# Altium schematic symbol library Transistor.SchLib: 3457 symbols (part 11 of 27)
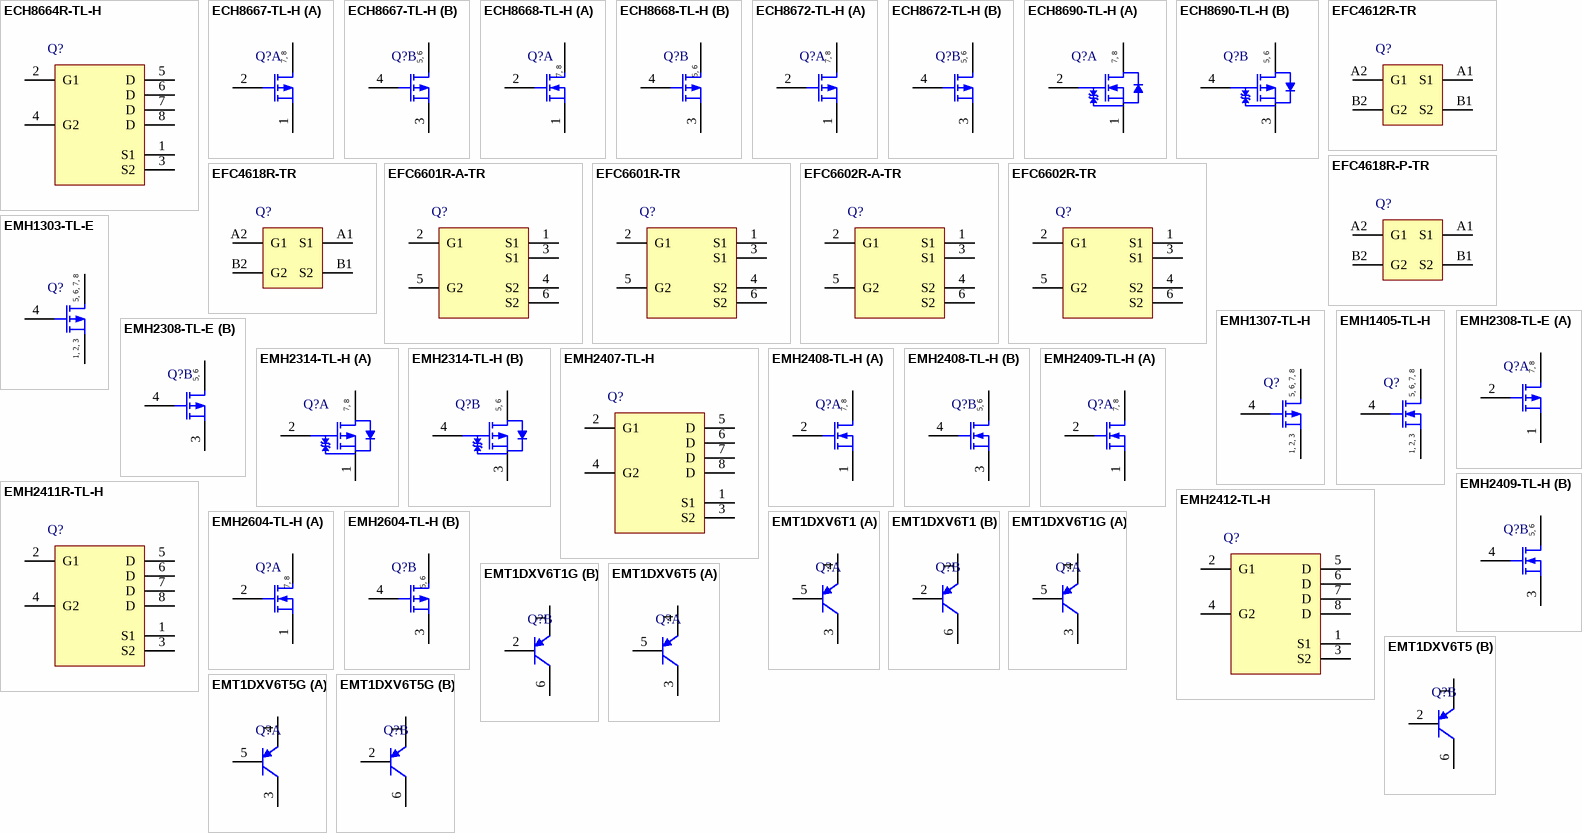
[diagram p104: symbols ECH8664R-TL-H to EMT1DXV6T5G]

## ECH8690-TL-H
designator Q?
Power MOSFET, 60 V, 4.7 A, 55 mOhm -60 V, -3.5 A, 94 mOhm Complememtary Dual, 8-Pin ECH, Pb-Free, Tape and Reel; Manufacturer: On Semiconductor; PartNumber: ECH8690-TL-H; Channel Polarity: Complementary; PD Max (W): 1.5; V(BR)DSS Min (V): 60; VGS Max (V): 20; VGS(th) Max (V): 2.6; PackageReference: ECH-8; PackageDescription: 8-Pin SOT23, Body 2.9 x 2.3 mm, Pitch 0.65 mm; Supplier 1: Newark; Supplier Part Number 1: 97W4990; Supplier 2: Mouser; Supplier Part Number 2: 863-ECH8690-TL-H; Configuration: Dual; Package Type: SOT-28 FL / ECH-8; Packing: Tape and Reel; RoHS: Pb-Free; Mounting Technology: Surface Mount; ComponentLink1Description: Manufacturer URL; ComponentLink1URL: http://www.onsemi.com/; ComponentLink2Description: Datasheet; ComponentLink2URL: http://www.onsemi.com/pub_link/Collateral/ENA2185-D.PDF; ComponentLink3Description: Package Specification; ComponentLink3URL: http://www.onsemi.com/pub_link/Collateral/ECH8308-D.PDF
footprint ONSC-ECH-8_V (SOT23, 8-Leads, Body 2.9x2.3mm, Pitch 0.65mm)
part A pins: 1 S1, 2 G1, 7 D1, 8 D1
part B pins: 3 S2, 4 G2, 5 D2, 6 D2
part A text: 7, 8
part B text: 5, 6

## EFC4612R-TR
designator Q?
N-Channel Power MOSFET, 24 V, 6 A, 45 mOhm, 4-Pin EFCP, Pb-Free, Tape and Reel; Manufacturer: On Semiconductor; PartNumber: EFC4612R-TR; Channel Polarity: N Channel; Configuration: Dual; V(BR)DSS Min (V): 24; VGS Max (V): 12; VGS(th) Max (V): 1.3; PackageVersion: Rev. O, 02/2012; PackageReference: EFCP1313-4CC-037-4-567DP; PackageDescription: 4-Ball Wafer Level Chip Scale Package, Body 1.26 x 1.26 mm, Pitch 0.65 mm; Supplier 1: Digi-Key; Supplier Part Number 1: EFC4612R-TR-ND; Supplier 2: Newark; Supplier Part Number 2: 65T1221; Supplier 3: Mouser; Supplier Part Number 3: 863-EFC4612R-TR; Package Type: WLCSP-4; Packing: Tape and Reel; RoHS: Pb-Free; Mounting Technology: Surface Mount; ComponentLink1Description: Manufacturer URL; ComponentLink1URL: http://www.onsemi.com/; ComponentLink2Description: Datasheet; ComponentLink2URL: http://www.onsemi.com/pub_link/Collateral/ENA1477-D.PDF; ComponentLink3Description: Package Specification; ComponentLink3URL: http://www.onsemi.com/pub_link/Collateral/567DP.PDF
footprint ONSC-EFCP1313-4CC-037-4-567DP (BGA, 4-Balls, Body 1.26x1.26mm, Pitch 0.65mm)
pins: A1 S1, A2 G1, B1 S2, B2 G2

## EFC4618R-P-TR
designator Q?
N-Channel Power MOSFET, 24 V, 6 A, 23 mOhm, 4-Pin EFCP, Pb-Free, Tape and Reel; Manufacturer: On Semiconductor; PartNumber: EFC4618R-P-TR; Channel Polarity: N Channel; Configuration: Dual; VGS Max (V): 12; VGS(th) Max (V): 1.3; PackageVersion: Rev. O, 02/2012; PackageReference: EFCP1818-4CC-037-4-567DK; PackageDescription: 4-Ball Wafer Level Chip Scale Package, Body 1.81 x 1.81 mm, Pitch 0.65 mm; Supplier 1: Mouser; Supplier Part Number 1: 863-EFC4618R-P-TR; Package Type: WLCSP-4; Packing: Tape and Reel; RoHS: Pb-Free; Mounting Technology: Surface Mount; ComponentLink1Description: Manufacturer URL; ComponentLink1URL: http://www.onsemi.com/; ComponentLink2Description: Datasheet; ComponentLink2URL: http://www.onsemi.com/pub_link/Collateral/ENA1123A-D.PDF; ComponentLink3Description: Package Specification; ComponentLink3URL: http://www.onsemi.com/pub_link/Collateral/567DK.PDF
footprint ONSC-EFCP1818-4CC-037-4-567DK_V (BGA, 4-Balls, Body 1.81x1.81mm, Pitch 0.65mm)
pins: A1 S1, A2 G1, B1 S2, B2 G2

## EFC4618R-TR
designator Q?
N-Channel Power MOSFET, 24 V, 6 A, 23 mOhm, 4-Pin EFCP, Pb-Free, Tape and Reel; Manufacturer: On Semiconductor; PartNumber: EFC4618R-TR; Channel Polarity: N Channel; Configuration: Dual; VGS Max (V): 12; VGS(th) Max (V): 1.3; PackageVersion: Rev. O, 02/2012; PackageReference: EFCP1818-4CC-037-4-567DK; PackageDescription: 4-Ball Wafer Level Chip Scale Package, Body 1.81 x 1.81 mm, Pitch 0.65 mm; Supplier 1: Digi-Key; Supplier Part Number 1: EFC4618R-TR-ND; Supplier 2: Mouser; Supplier Part Number 2: 863-EFC4618R-TR; Package Type: WLCSP-4; Packing: Tape and Reel; RoHS: Pb-Free; Mounting Technology: Surface Mount; ComponentLink1Description: Manufacturer URL; ComponentLink1URL: http://www.onsemi.com/; ComponentLink2Description: Datasheet; ComponentLink2URL: http://www.onsemi.com/pub_link/Collateral/ENA1123A-D.PDF; ComponentLink3Description: Package Specification; ComponentLink3URL: http://www.onsemi.com/pub_link/Collateral/567DK.PDF
footprint ONSC-EFCP1818-4CC-037-4-567DK_V (BGA, 4-Balls, Body 1.81x1.81mm, Pitch 0.65mm)
pins: A1 S1, A2 G1, B1 S2, B2 G2

## EFC6601R-A-TR
designator Q?
N-Channel Power MOSFET, 24 V, 13 A, 11.5 mOhm, 6-Pin EFCP, Pb-Free, Tape and Reel; Manufacturer: On Semiconductor; PartNumber: EFC6601R-A-TR; Channel Polarity: N Channel; Configuration: Dual; VGS Max (V): 12; VGS(th) Max (V): 1.3; PackageVersion: Rev. O, 05/2012; PackageReference: EFCP2718-6CE-020-6-567FK; PackageDescription: 6-Ball Wafer Level Chip Scale Package, Body 2.7 x 1.81 mm, Pitch 0.65 mm; Supplier 1: Newark; Supplier Part Number 1: 56W5203; Supplier 2: Mouser; Supplier Part Number 2: 863-EFC6601R-A-TR; Package Type: WLCSP-6; Packing: Tape and Reel; RoHS: Pb-Free; Mounting Technology: Surface Mount; ComponentLink1Description: Manufacturer URL; ComponentLink1URL: http://www.onsemi.com/; ComponentLink2Description: Datasheet; ComponentLink2URL: http://www.onsemi.com/pub_link/Collateral/ENA2151-D.PDF; ComponentLink3Description: Package Specification; ComponentLink3URL: http://www.onsemi.com/pub_link/Collateral/ENA2152-D.PDF
footprint ONSC-EFCP2718-6CE-020-6-567FK (BGA, 6-Balls, Body 2.7x1.81mm, Pitch 0.65mm)
pins: 1 S1, 2 G1, 3 S1, 4 S2, 5 G2, 6 S2

## EFC6601R-TR
designator Q?
N-Channel Power MOSFET, 24 V, 13 A, 11.5 mOhm, 6-Pin EFCP, Pb-Free, Tape and Reel; Manufacturer: On Semiconductor; PartNumber: EFC6601R-TR; Channel Polarity: N Channel; Configuration: Dual; VGS Max (V): 12; VGS(th) Max (V): 1.3; PackageVersion: Rev. O, 05/2012; PackageReference: EFCP2718-6CE-020-6-567FK; PackageDescription: 6-Ball Wafer Level Chip Scale Package, Body 2.7 x 1.81 mm, Pitch 0.65 mm; Supplier 1: Newark; Supplier Part Number 1: 56W5204; Supplier 2: Mouser; Supplier Part Number 2: 863-EFC6601R-TR; Package Type: WLCSP-6; Packing: Tape and Reel; RoHS: Pb-Free; Mounting Technology: Surface Mount; ComponentLink1Description: Manufacturer URL; ComponentLink1URL: http://www.onsemi.com/; ComponentLink2Description: Datasheet; ComponentLink2URL: http://www.onsemi.com/pub_link/Collateral/ENA2151-D.PDF; ComponentLink3Description: Package Specification; ComponentLink3URL: http://www.onsemi.com/pub_link/Collateral/ENA2152-D.PDF
footprint ONSC-EFCP2718-6CE-020-6-567FK (BGA, 6-Balls, Body 2.7x1.81mm, Pitch 0.65mm)
pins: 1 S1, 2 G1, 3 S1, 4 S2, 5 G2, 6 S2

## EFC6602R-A-TR
designator Q?
N-Channel Power MOSFET, 12 V, 18 A, 5.9 mOhm, 6-Pin EFCP, Pb-Free, Tape and Reel; Manufacturer: On Semiconductor; PartNumber: EFC6602R-A-TR; Channel Polarity: N Channel; Configuration: Dual; VGS Max (V): 12; VGS(th) Max (V): 1.3; PackageVersion: Rev. O, 05/2012; PackageReference: EFCP2718-6CE-020-6-567FK; PackageDescription: 6-Ball Wafer Level Chip Scale Package, Body 2.7 x 1.81 mm, Pitch 0.65 mm; Supplier 1: Newark; Supplier Part Number 1: 56W5205; Supplier 2: Mouser; Supplier Part Number 2: 863-EFC6602R-A-TR; Package Type: WLCSP-6; Packing: Tape and Reel; RoHS: Pb-Free; Mounting Technology: Surface Mount; ComponentLink1Description: Manufacturer URL; ComponentLink1URL: http://www.onsemi.com/; ComponentLink2Description: Datasheet; ComponentLink2URL: http://www.onsemi.com/pub_link/Collateral/ENA2152-D.PDF; ComponentLink3Description: Package Specification; ComponentLink3URL: http://www.onsemi.com/pub_link/Collateral/ENA2152-D.PDF
footprint ONSC-EFCP2718-6CE-020-6-567FK (BGA, 6-Balls, Body 2.7x1.81mm, Pitch 0.65mm)
pins: 1 S1, 2 G1, 3 S1, 4 S2, 5 G2, 6 S2

## EFC6602R-TR
designator Q?
N-Channel Power MOSFET, 12 V, 18 A, 5.9 mOhm, 6-Pin EFCP, Pb-Free, Tape and Reel; Manufacturer: On Semiconductor; PartNumber: EFC6602R-TR; Channel Polarity: N Channel; Configuration: Dual; VGS Max (V): 12; VGS(th) Max (V): 1.3; PackageVersion: Rev. O, 05/2012; PackageReference: EFCP2718-6CE-020-6-567FK; PackageDescription: 6-Ball Wafer Level Chip Scale Package, Body 2.7 x 1.81 mm, Pitch 0.65 mm; Supplier 1: Newark; Supplier Part Number 1: 45W8151; Supplier 2: Mouser; Supplier Part Number 2: 863-EFC6602R-TR; Package Type: WLCSP-6; Packing: Tape and Reel; RoHS: Pb-Free; Mounting Technology: Surface Mount; ComponentLink1Description: Manufacturer URL; ComponentLink1URL: http://www.onsemi.com/; ComponentLink2Description: Datasheet; ComponentLink2URL: http://www.onsemi.com/pub_link/Collateral/ENA2152-D.PDF; ComponentLink3Description: Package Specification; ComponentLink3URL: http://www.onsemi.com/pub_link/Collateral/ENA2152-D.PDF
footprint ONSC-EFCP2718-6CE-020-6-567FK (BGA, 6-Balls, Body 2.7x1.81mm, Pitch 0.65mm)
pins: 1 S1, 2 G1, 3 S1, 4 S2, 5 G2, 6 S2

## EMH1303-TL-E
designator Q?
P-Channel Power MOSFET, -12 V, -7 A, 23 mOhm, 8-Pin EMH, Pb-Free, Tape and Reel; Manufacturer: On Semiconductor; PartNumber: EMH1303-TL-E; Channel Polarity: P Channel; Ciss Typ (pF): 1100; Configuration: Single; Coss Typ (pF): 350; Crss Typ (pF): 265; ID Max (A): 7; PD Max (W): 1.5; V(BR)DSS Min (V): 12; VGS Max (V): 10; VGS(th) Max (V): 1.2; PackageReference: EMH-8; PackageDescription: 8-Pin SOT23, Body 2 x 1.7 mm, Pitch 0.5 mm; Supplier 1: Digi-Key; Supplier Part Number 1: EMH1303-TL-E-ND; Supplier 2: Mouser; Supplier Part Number 2: 863-EMH1303-TL-E; Package Type: SOT-383FL / EMH-8; Packing: Tape and Reel; RoHS: Pb-Free; Mounting Technology: Surface Mount; ComponentLink1Description: Manufacturer URL; ComponentLink1URL: http://www.onsemi.com/; ComponentLink2Description: Datasheet; ComponentLink2URL: http://www.onsemi.com/pub_link/Collateral/EMH1303-D.PDF; ComponentLink3Description: Package Specification; ComponentLink3URL: http://www.onsemi.com/pub_link/Collateral/EMH1303-D.PDF
footprint ONSC-EMH-8_V (SOT23, 8-Leads, Body 2x1.7mm, Pitch 0.5mm)
pins: 1 S, 2 S, 3 S, 4 G, 5 D, 6 D, 7 D, 8 D
text: 5, 6, 7, 8; 1, 2, 3

## EMH1307-TL-H
designator Q?
P-Channel Power MOSFET, -20 V, -6.5 A, 26 mOhm, 8-Pin EMH, Pb-Free, Tape and Reel; Manufacturer: On Semiconductor; PartNumber: EMH1307-TL-H; Channel Polarity: P Channel; Ciss Typ (pF): 1100; Configuration: Single; Coss Typ (pF): 210; Crss Typ (pF): 160; ID Max (A): 6.5; PD Max (W): 1.5; V(BR)DSS Min (V): 20; VGS Max (V): 10; VGS(th) Max (V): 1.3; PackageReference: EMH-8; PackageDescription: 8-Pin SOT23, Body 2 x 1.7 mm, Pitch 0.5 mm; Supplier 1: Digi-Key; Supplier Part Number 1: EMH1307-TL-H-ND; Supplier 2: Mouser; Supplier Part Number 2: 863-EMH1307-TL-H; Package Type: SOT-383FL / EMH-8; Packing: Tape and Reel; RoHS: Pb-Free; Mounting Technology: Surface Mount; ComponentLink1Description: Manufacturer URL; ComponentLink1URL: http://www.onsemi.com/; ComponentLink2Description: Datasheet; ComponentLink2URL: http://www.onsemi.com/pub_link/Collateral/EMH1307-D.PDF; ComponentLink3Description: Package Specification; ComponentLink3URL: http://www.onsemi.com/pub_link/Collateral/EMH1303-D.PDF
footprint ONSC-EMH-8_V (SOT23, 8-Leads, Body 2x1.7mm, Pitch 0.5mm)
pins: 1 S, 2 S, 3 S, 4 G, 5 D, 6 D, 7 D, 8 D
text: 5, 6, 7, 8; 1, 2, 3

## EMH1405-TL-H
designator Q?
N-Channel Power MOSFET, 30 V, 8.5 A, 19 mOhm, 8-Pin EMH, Pb-Free, Tape and Reel; Manufacturer: On Semiconductor; PartNumber: EMH1405-TL-H; Channel Polarity: N Channel; Ciss Typ (pF): 820; Configuration: Single; Coss Typ (pF): 130; Crss Typ (pF): 90; ID Max (A): 8.5; PD Max (W): 1.5; V(BR)DSS Min (V): 30; VGS Max (V): 20; VGS(th) Max (V): 2.6; PackageReference: EMH-8; PackageDescription: 8-Pin SOT23, Body 2 x 1.7 mm, Pitch 0.5 mm; Supplier 1: Digi-Key; Supplier Part Number 1: EMH1405-TL-H-ND; Supplier 2: Mouser; Supplier Part Number 2: 863-EMH1405-TL-H; Package Type: SOT-383FL / EMH-8; Packing: Tape and Reel; RoHS: Pb-Free; Mounting Technology: Surface Mount; ComponentLink1Description: Manufacturer URL; ComponentLink1URL: http://www.onsemi.com/; ComponentLink2Description: Datasheet; ComponentLink2URL: http://www.onsemi.com/pub_link/Collateral/EMH1405-D.PDF; ComponentLink3Description: Package Specification; ComponentLink3URL: http://www.onsemi.com/pub_link/Collateral/EMH1303-D.PDF
footprint ONSC-EMH-8_V (SOT23, 8-Leads, Body 2x1.7mm, Pitch 0.5mm)
pins: 1 S, 2 S, 3 S, 4 G, 5 D, 6 D, 7 D, 8 D
text: 5, 6, 7, 8; 1, 2, 3

## EMH2308-TL-E
designator Q?
P-Channel Power MOSFET, -20 V, -3 A, 85 mOhm, 8-Pin EMH, Pb-Free, Tape and Reel; Manufacturer: On Semiconductor; PartNumber: EMH2308-TL-E; Channel Polarity: P Channel; Ciss Typ (pF): 320; Configuration: Dual; Coss Typ (pF): 66; Crss Typ (pF): 50; ID Max (A): 3; PD Max (W): 1; V(BR)DSS Min (V): 20; VGS Max (V): 10; VGS(th) Max (V): 1.3; PackageReference: EMH-8; PackageDescription: 8-Pin SOT23, Body 2 x 1.7 mm, Pitch 0.5 mm; Supplier 1: Digi-Key; Supplier Part Number 1: EMH2308-TL-E-ND; Supplier 2: Mouser; Supplier Part Number 2: 863-EMH2308-TL-E; Package Type: SOT-383FL / EMH-8; Packing: Tape and Reel; RoHS: Pb-Free; Mounting Technology: Surface Mount; ComponentLink1Description: Manufacturer URL; ComponentLink1URL: http://www.onsemi.com/; ComponentLink2Description: Datasheet; ComponentLink2URL: http://www.onsemi.com/pub_link/Collateral/EMH2308-D.PDF; ComponentLink3Description: Package Specification; ComponentLink3URL: http://www.onsemi.com/pub_link/Collateral/EMH1303-D.PDF
footprint ONSC-EMH-8_V (SOT23, 8-Leads, Body 2x1.7mm, Pitch 0.5mm)
part A pins: 1 S1, 2 G1, 7 D1, 8 D1
part B pins: 3 S2, 4 G2, 5 D2, 6 D2
part A text: 7, 8
part B text: 5, 6

## EMH2314-TL-H
designator Q?
P-Channel Power MOSFET, -12 V, -5 A, 37 mOhm, 8-Pin EMH, Pb-Free, Tape and Reel; Manufacturer: On Semiconductor; PartNumber: EMH2314-TL-H; Channel Polarity: P Channel; Ciss Typ (pF): 1300; Configuration: Dual; Coss Typ (pF): 158; Crss Typ (pF): 143; ID Max (A): 5; PD Max (W): 1; V(BR)DSS Min (V): 12; VGS Max (V): 10; VGS(th) Max (V): 1.3; PackageReference: EMH-8; PackageDescription: 8-Pin SOT23, Body 2 x 1.7 mm, Pitch 0.5 mm; Supplier 1: Digi-Key; Supplier Part Number 1: EMH2314-TL-H-ND; Supplier 2: Mouser; Supplier Part Number 2: 863-EMH2314-TL-H; Package Type: SOT-383FL / EMH-8; Packing: Tape and Reel; RoHS: Pb-Free; Mounting Technology: Surface Mount; ComponentLink1Description: Manufacturer URL; ComponentLink1URL: http://www.onsemi.com/; ComponentLink2Description: Datasheet; ComponentLink2URL: http://www.onsemi.com/pub_link/Collateral/EN8759-D.PDF; ComponentLink3Description: Package Specification; ComponentLink3URL: http://www.onsemi.com/pub_link/Collateral/EMH1303-D.PDF
footprint ONSC-EMH-8_V (SOT23, 8-Leads, Body 2x1.7mm, Pitch 0.5mm)
part A pins: 1 S1, 2 G1, 7 D1, 8 D1
part B pins: 3 S2, 4 G2, 5 D2, 6 D2
part A text: 7, 8
part B text: 5, 6

## EMH2407-TL-H
designator Q?
N-Channel Power MOSFET, 20 V, 6 A, 25 mOhm, 8-Pin EMH, Pb-Free, Tape and Reel; Manufacturer: On Semiconductor; PartNumber: EMH2407-TL-H; Channel Polarity: N Channel; Ciss Typ (pF): 580; Configuration: Dual; Coss Typ (pF): 95; Crss Typ (pF): 75; ID Max (A): 6; PD Max (W): 1.3; V(BR)DSS Min (V): 20; VGS Max (V): 12; PackageReference: EMH-8; PackageDescription: 8-Pin SOT23, Body 2 x 1.7 mm, Pitch 0.5 mm; Supplier 1: Digi-Key; Supplier Part Number 1: EMH2407-TL-H-ND; Supplier 2: Mouser; Supplier Part Number 2: 863-EMH2407-TL-H; Package Type: SOT-383FL / EMH-8; Packing: Tape and Reel; RoHS: Pb-Free; VGS(th) Max (V): 1.3; Mounting Technology: Surface Mount; ComponentLink1Description: Manufacturer URL; ComponentLink1URL: http://www.onsemi.com/; ComponentLink2Description: Datasheet; ComponentLink2URL: http://www.onsemi.com/pub_link/Collateral/ENA1141-D.PDF; ComponentLink3Description: Package Specification; ComponentLink3URL: http://www.onsemi.com/pub_link/Collateral/EMH1303-D.PDF
footprint ONSC-EMH-8_V (SOT23, 8-Leads, Body 2x1.7mm, Pitch 0.5mm)
pins: 1 S1, 2 G1, 3 S2, 4 G2, 5 D, 6 D, 7 D, 8 D

## EMH2408-TL-H
designator Q?
N-Channel Power MOSFET, 20 V, 4 A, 45 mOhm, 8-Pin EMH, Pb-Free, Tape and Reel; Manufacturer: On Semiconductor; PartNumber: EMH2408-TL-H; Channel Polarity: N Channel; Ciss Typ (pF): 345; Configuration: Dual; Coss Typ (pF): 67; Crss Typ (pF): 52; ID Max (A): 4; PD Max (W): 1; V(BR)DSS Min (V): 20; VGS Max (V): 12; VGS(th) Max (V): 1.3; PackageReference: EMH-8; PackageDescription: 8-Pin SOT23, Body 2 x 1.7 mm, Pitch 0.5 mm; Supplier 1: Digi-Key; Supplier Part Number 1: EMH2408-TL-H-ND; Supplier 2: Mouser; Supplier Part Number 2: 863-EMH2408-TL-H; Package Type: SOT-383FL / EMH-8; Packing: Tape and Reel; RoHS: Pb-Free; Mounting Technology: Surface Mount; ComponentLink1Description: Manufacturer URL; ComponentLink1URL: http://www.onsemi.com/; ComponentLink2Description: Datasheet; ComponentLink2URL: http://www.onsemi.com/pub_link/Collateral/EMH2408-D.PDF; ComponentLink3Description: Package Specification; ComponentLink3URL: http://www.onsemi.com/pub_link/Collateral/EMH1303-D.PDF
footprint ONSC-EMH-8_V (SOT23, 8-Leads, Body 2x1.7mm, Pitch 0.5mm)
part A pins: 1 S1, 2 G1, 7 D1, 8 D1
part B pins: 3 S2, 4 G2, 5 D2, 6 D2
part A text: 7, 8
part B text: 5, 6

## EMH2409-TL-H
designator Q?
N-Channel Power MOSFET, 30 V, 4 A, 59 mOhm, 8-Pin EMH, Pb-Free, Tape and Reel; Manufacturer: On Semiconductor; PartNumber: EMH2409-TL-H; Channel Polarity: N Channel; Ciss Typ (pF): 240; Configuration: Dual; Coss Typ (pF): 45; Crss Typ (pF): 30; ID Max (A): 4; PD Max (W): 1; VGS Max (V): 20; VGS(th) Max (V): 2.6; PackageReference: EMH-8; PackageDescription: 8-Pin SOT23, Body 2 x 1.7 mm, Pitch 0.5 mm; Supplier 1: Digi-Key; Supplier Part Number 1: EMH2409-TL-H-ND; Supplier 2: Mouser; Supplier Part Number 2: 863-EMH2409-TL-H; Package Type: SOT-383FL / EMH-8; Packing: Tape and Reel; RoHS: Pb-Free; V(BR)DSS Min (V): 30; Mounting Technology: Surface Mount; ComponentLink1Description: Manufacturer URL; ComponentLink1URL: http://www.onsemi.com/; ComponentLink2Description: Datasheet; ComponentLink2URL: http://www.onsemi.com/pub_link/Collateral/EMH2409-D.PDF; ComponentLink3Description: Package Specification; ComponentLink3URL: http://www.onsemi.com/pub_link/Collateral/EMH1303-D.PDF
footprint ONSC-EMH-8_V (SOT23, 8-Leads, Body 2x1.7mm, Pitch 0.5mm)
part A pins: 1 S1, 2 G1, 7 D1, 8 D1
part B pins: 3 S2, 4 G2, 5 D2, 6 D2
part A text: 7, 8
part B text: 5, 6

## EMH2411R-TL-H
designator Q?
N-Channel Power MOSFET, 30 V, 5 A, 36.5 Ohm, 8-Pin EMH, Pb-Free, Tape and Reel; Manufacturer: On Semiconductor; PartNumber: EMH2411R-TL-H; Channel Polarity: N Channel; Configuration: Dual; ID Max (A): 5; PD Max (W): 1.3; V(BR)DSS Min (V): 30; VGS Max (V): 12; PackageReference: EMH-8; PackageDescription: 8-Pin SOT23, Body 2 x 1.7 mm, Pitch 0.5 mm; Supplier 1: Digi-Key; Supplier Part Number 1: EMH2411R-TL-H-ND; Supplier 2: Mouser; Supplier Part Number 2: 863-EMH2411R-TL-H; Package Type: SOT-383FL / EMH-8; Packing: Tape and Reel; RoHS: Pb-Free; VGS(th) Max (V): 1.3; Mounting Technology: Surface Mount; ComponentLink1Description: Manufacturer URL; ComponentLink1URL: http://www.onsemi.com/; ComponentLink2Description: Datasheet; ComponentLink2URL: http://www.onsemi.com/pub_link/Collateral/ENA1421-D.PDF; ComponentLink3Description: Package Specification; ComponentLink3URL: http://www.onsemi.com/pub_link/Collateral/EMH1303-D.PDF
footprint ONSC-EMH-8_V (SOT23, 8-Leads, Body 2x1.7mm, Pitch 0.5mm)
pins: 1 S1, 2 G1, 3 S2, 4 G2, 5 D, 6 D, 7 D, 8 D

## EMH2412-TL-H
designator Q?
N-Channel Power MOSFET, 24 V, 6 A, 27 mOhm, 8-Pin EMH, Pb-Free, Tape and Reel; Manufacturer: On Semiconductor; PartNumber: EMH2412-TL-H; Channel Polarity: N Channel; Configuration: Dual; ID Max (A): 6; PD Max (W): 1.3; V(BR)DSS Min (V): 24; VGS Max (V): 12; PackageReference: EMH-8; PackageDescription: 8-Pin SOT23, Body 2 x 1.7 mm, Pitch 0.5 mm; Supplier 1: Digi-Key; Supplier Part Number 1: EMH2412-TL-H-ND; Supplier 2: Mouser; Supplier Part Number 2: 863-EMH2412-TL-H; Package Type: SOT-383FL / EMH-8; Packing: Tape and Reel; RoHS: Pb-Free; VGS(th) Max (V): 1.3; Mounting Technology: Surface Mount; ComponentLink1Description: Manufacturer URL; ComponentLink1URL: http://www.onsemi.com/; ComponentLink2Description: Datasheet; ComponentLink2URL: http://www.onsemi.com/pub_link/Collateral/EMH2412-D.PDF; ComponentLink3Description: Package Specification; ComponentLink3URL: http://www.onsemi.com/pub_link/Collateral/EMH1303-D.PDF
footprint ONSC-EMH-8_V (SOT23, 8-Leads, Body 2x1.7mm, Pitch 0.5mm)
pins: 1 S1, 2 G1, 3 S2, 4 G2, 5 D, 6 D, 7 D, 8 D

## EMH2604-TL-H
designator Q?
Power MOSFET, 20 V, 4 A, 45 mOhm, -20 V, -3 A, 85 mOhm, 8-Pin EMH, Pb-Free, Tape and Reel; Manufacturer: On Semiconductor; PartNumber: EMH2604-TL-H; Channel Polarity: Complementary; Configuration: Dual; PD Max (W): 1; V(BR)DSS Min (V): 20; VGS Max (V): 10; VGS(th) Max (V): 1.3; PackageReference: EMH-8; PackageDescription: 8-Pin SOT23, Body 2 x 1.7 mm, Pitch 0.5 mm; Supplier 1: Digi-Key; Supplier Part Number 1: EMH2604-TL-H-ND; Supplier 2: Mouser; Supplier Part Number 2: 863-EMH2604-TL-H; Package Type: SOT-383FL / EMH-8; Packing: Tape and Reel; RoHS: Pb-Free; Mounting Technology: Surface Mount; ComponentLink1Description: Manufacturer URL; ComponentLink1URL: http://www.onsemi.com/; ComponentLink2Description: Datasheet; ComponentLink2URL: http://www.onsemi.com/pub_link/Collateral/EMH2604-D.PDF; ComponentLink3Description: Package Specification; ComponentLink3URL: http://www.onsemi.com/pub_link/Collateral/EMH1303-D.PDF
footprint ONSC-EMH-8_V (SOT23, 8-Leads, Body 2x1.7mm, Pitch 0.5mm)
part A pins: 1 S1, 2 G1, 7 D1, 8 D1
part B pins: 3 S2, 4 G2, 5 D2, 6 D2
part A text: 7, 8
part B text: 5, 6

## EMT1DXV6T1
designator Q?
Dual General Purpose Transistors, PNP, 6-Pin SOT-563, Pb-Free, Tape and Reel; Manufacturer: On Semiconductor; PartNumber: EMT1DXV6T1; IC Continuous (A): -0.1; Polarity: Dual PNP; DatasheetVersion: Rev. 1; PackageVersion: Rev. F, 04/2005; PackageReference: SOT-563-6-463A-01; PackageDescription: 6-Pin Small Outline Transistor, Body 1.6 x 1.2 mm, Pitch 0.5 mm; Supplier 1: Digi-Key; Supplier Part Number 1: EMT1DXV6T1-ND; Supplier 2: Mouser; Supplier Part Number 2: 863-EMT1DXV6T1; Packing: Tape and Reel; RoHS: TRUE; Mounting Technology: Surface Mount; ComponentLink1Description: Manufacturer URL; ComponentLink1URL: http://www.onsemi.com/; ComponentLink2Description: Datasheet; ComponentLink2URL: http://www.onsemi.com/pub_link/Collateral/EMT1DXV6T1-D.PDF; ComponentLink3Description: Package Specification; ComponentLink3URL: http://www.onsemi.cn/pub_link/Collateral/463A-01.PDF
footprint ONSC-SOT-563-6-463A-01_V (SOT23, 6-Leads, Body 1.6x1.2mm, Pitch 0.5mm)
part A pins: 3 C, 4 E, 5 B
part B pins: 1 E, 2 B, 6 C

## EMT1DXV6T1G
designator Q?
Dual General Purpose Transistors, PNP, 6-Pin SOT-563, Pb-Free, Tape and Reel; Manufacturer: On Semiconductor; PartNumber: EMT1DXV6T1G; IC Continuous (A): -0.1; Polarity: Dual PNP; DatasheetVersion: Rev. 1; PackageVersion: Rev. F, 04/2005; PackageReference: SOT-563-6-463A-01; PackageDescription: 6-Pin Small Outline Transistor, Body 1.6 x 1.2 mm, Pitch 0.5 mm; Supplier 1: Digi-Key; Supplier Part Number 1: EMT1DXV6T1G-ND; Supplier 2: Newark; Supplier Part Number 2: 41K9774; Supplier 3: Mouser; Supplier Part Number 3: 863-EMT1DXV6T1G; Packing: Tape and Reel; RoHS: TRUE; Mounting Technology: Surface Mount; ComponentLink1Description: Manufacturer URL; ComponentLink1URL: http://www.onsemi.com/; ComponentLink2Description: Datasheet; ComponentLink2URL: http://www.onsemi.com/pub_link/Collateral/EMT1DXV6T1-D.PDF; ComponentLink3Description: Package Specification; ComponentLink3URL: http://www.onsemi.cn/pub_link/Collateral/463A-01.PDF
footprint ONSC-SOT-563-6-463A-01_V (SOT23, 6-Leads, Body 1.6x1.2mm, Pitch 0.5mm)
part A pins: 3 C, 4 E, 5 B
part B pins: 1 E, 2 B, 6 C

## EMT1DXV6T5
designator Q?
Dual General Purpose Transistors, PNP, 6-Pin SOT-563, Pb-Free, Tape and Reel; Manufacturer: On Semiconductor; PartNumber: EMT1DXV6T5; IC Continuous (A): -0.1; Polarity: Dual PNP; DatasheetVersion: Rev. 1; PackageVersion: Rev. F, 04/2005; PackageReference: SOT-563-6-463A-01; PackageDescription: 6-Pin Small Outline Transistor, Body 1.6 x 1.2 mm, Pitch 0.5 mm; Supplier 1: Digi-Key; Supplier Part Number 1: EMT1DXV6T5-ND; Supplier 2: Mouser; Supplier Part Number 2: 863-EMT1DXV6T5; Packing: Tape and Reel; RoHS: TRUE; Mounting Technology: Surface Mount; ComponentLink1Description: Manufacturer URL; ComponentLink1URL: http://www.onsemi.com/; ComponentLink2Description: Datasheet; ComponentLink2URL: http://www.onsemi.com/pub_link/Collateral/EMT1DXV6T1-D.PDF; ComponentLink3Description: Package Specification; ComponentLink3URL: http://www.onsemi.cn/pub_link/Collateral/463A-01.PDF
footprint ONSC-SOT-563-6-463A-01_V (SOT23, 6-Leads, Body 1.6x1.2mm, Pitch 0.5mm)
part A pins: 3 C, 4 E, 5 B
part B pins: 1 E, 2 B, 6 C

## EMT1DXV6T5G
designator Q?
Dual General Purpose Transistors, PNP, 6-Pin SOT-563, Pb-Free, Tape and Reel; Manufacturer: On Semiconductor; PartNumber: EMT1DXV6T5G; IC Continuous (A): -0.1; Polarity: Dual PNP; DatasheetVersion: Rev. 1; PackageVersion: Rev. F, 04/2005; PackageReference: SOT-563-6-463A-01; PackageDescription: 6-Pin Small Outline Transistor, Body 1.6 x 1.2 mm, Pitch 0.5 mm; Supplier 1: Digi-Key; Supplier Part Number 1: EMT1DXV6T5G-ND; Supplier 2: Mouser; Supplier Part Number 2: 863-EMT1DXV6T5G; Packing: Tape and Reel; RoHS: TRUE; Mounting Technology: Surface Mount; ComponentLink1Description: Manufacturer URL; ComponentLink1URL: http://www.onsemi.com/; ComponentLink2Description: Datasheet; ComponentLink2URL: http://www.onsemi.com/pub_link/Collateral/EMT1DXV6T1-D.PDF; ComponentLink3Description: Package Specification; ComponentLink3URL: http://www.onsemi.cn/pub_link/Collateral/463A-01.PDF
footprint ONSC-SOT-563-6-463A-01_V (SOT23, 6-Leads, Body 1.6x1.2mm, Pitch 0.5mm)
part A pins: 3 C, 4 E, 5 B
part B pins: 1 E, 2 B, 6 C

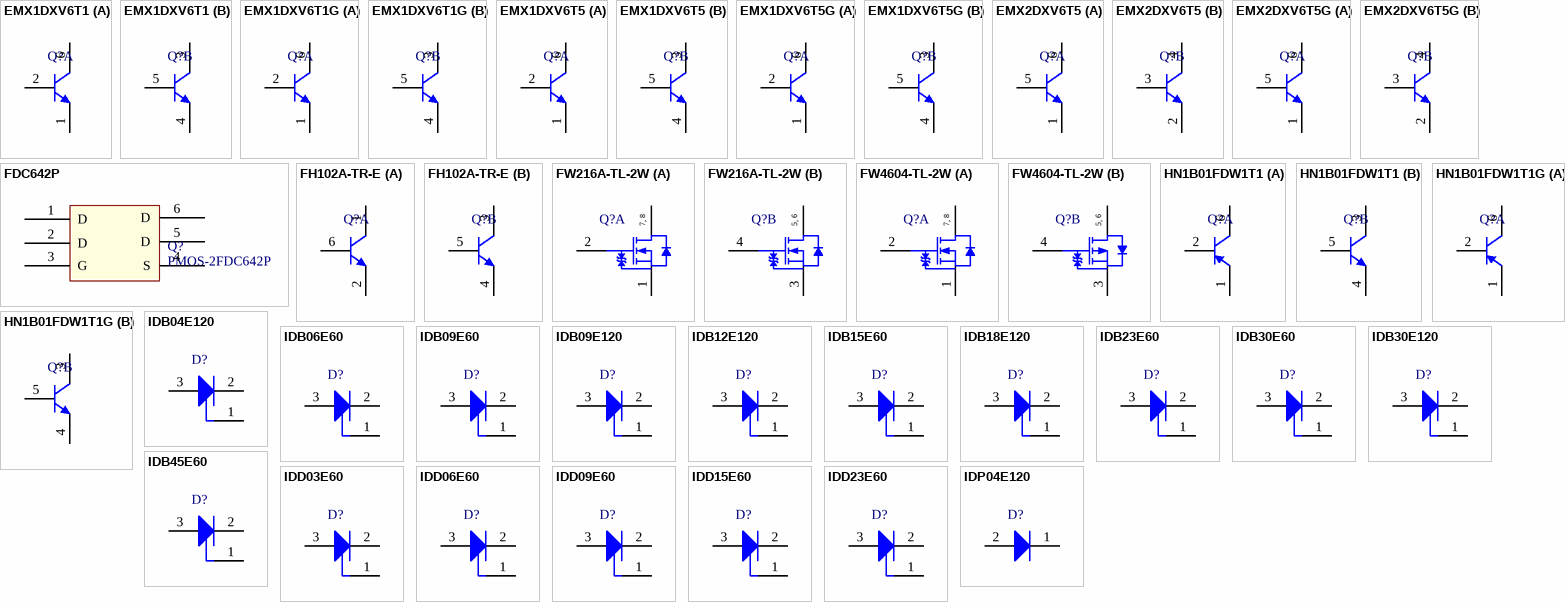
[diagram p36: symbols EMX1DXV6T1 to IDP04E120]

## EMX1DXV6T1
designator Q?
Dual NPN General Purpose Amplifier Transistors, 6-Pin SOT-563, Pb-Free, Tape and Reel; Manufacturer: On Semiconductor; PartNumber: EMX1DXV6T1; IC Continuous (A): 0.1; DatasheetVersion: Rev. 1; PackageVersion: Rev. F, 04/2005; PackageReference: SOT-563-6-463A-01; PackageDescription: 6-Pin Small Outline Transistor, Body 1.6 x 1.2 mm, Pitch 0.5 mm; Supplier 1: Digi-Key; Supplier Part Number 1: EMX1DXV6T1-ND; Supplier 2: Mouser; Supplier Part Number 2: 863-EMX1DXV6T1; Packing: Tape and Reel; Polarity: Dual NPN; RoHS: TRUE; Mounting Technology: Surface Mount; ComponentLink1Description: Manufacturer URL; ComponentLink1URL: http://www.onsemi.com/; ComponentLink2Description: Datasheet; ComponentLink2URL: http://www.onsemi.com/pub_link/Collateral/EMX1DXV6T1-D.PDF; ComponentLink3Description: Package Specification; ComponentLink3URL: http://www.onsemi.cn/pub_link/Collateral/463A-01.PDF
footprint ONSC-SOT-563-6-463A-01_V (SOT23, 6-Leads, Body 1.6x1.2mm, Pitch 0.5mm)
part A pins: 1 E, 2 B, 6 C
part B pins: 3 C, 4 E, 5 B

## EMX1DXV6T1G
designator Q?
Dual NPN General Purpose Amplifier Transistors, 6-Pin SOT-563, Pb-Free, Tape and Reel; Manufacturer: On Semiconductor; PartNumber: EMX1DXV6T1G; IC Continuous (A): 0.1; DatasheetVersion: Rev. 1; PackageVersion: Rev. F, 04/2005; PackageReference: SOT-563-6-463A-01; PackageDescription: 6-Pin Small Outline Transistor, Body 1.6 x 1.2 mm, Pitch 0.5 mm; Supplier 1: Digi-Key; Supplier Part Number 1: EMX1DXV6T1G-ND; Supplier 2: Mouser; Supplier Part Number 2: 863-EMX1DXV6T1G; Packing: Tape and Reel; Polarity: Dual NPN; RoHS: TRUE; Mounting Technology: Surface Mount; ComponentLink1Description: Manufacturer URL; ComponentLink1URL: http://www.onsemi.com/; ComponentLink2Description: Datasheet; ComponentLink2URL: http://www.onsemi.com/pub_link/Collateral/EMX1DXV6T1-D.PDF; ComponentLink3Description: Package Specification; ComponentLink3URL: http://www.onsemi.cn/pub_link/Collateral/463A-01.PDF
footprint ONSC-SOT-563-6-463A-01_V (SOT23, 6-Leads, Body 1.6x1.2mm, Pitch 0.5mm)
part A pins: 1 E, 2 B, 6 C
part B pins: 3 C, 4 E, 5 B

## EMX1DXV6T5
designator Q?
Dual NPN General Purpose Amplifier Transistors, 6-Pin SOT-563, Pb-Free, Tape and Reel; Manufacturer: On Semiconductor; PartNumber: EMX1DXV6T5; IC Continuous (A): 0.1; DatasheetVersion: Rev. 1; PackageVersion: Rev. F, 04/2005; PackageReference: SOT-563-6-463A-01; PackageDescription: 6-Pin Small Outline Transistor, Body 1.6 x 1.2 mm, Pitch 0.5 mm; Supplier 1: Mouser; Supplier Part Number 1: 863-EMX1DXV6T5; Packing: Tape and Reel; Polarity: Dual NPN; RoHS: TRUE; Mounting Technology: Surface Mount; ComponentLink1Description: Manufacturer URL; ComponentLink1URL: http://www.onsemi.com/; ComponentLink2Description: Datasheet; ComponentLink2URL: http://www.onsemi.com/pub_link/Collateral/EMX1DXV6T1-D.PDF; ComponentLink3Description: Package Specification; ComponentLink3URL: http://www.onsemi.cn/pub_link/Collateral/463A-01.PDF
footprint ONSC-SOT-563-6-463A-01_V (SOT23, 6-Leads, Body 1.6x1.2mm, Pitch 0.5mm)
part A pins: 1 E, 2 B, 6 C
part B pins: 3 C, 4 E, 5 B